# Altium footprint library AOO.PcbLib: 131 footprints (part 9 of 9)
Each footprint in its own frame and in the unit in brackets; x right, y up, seen from the top. Pads: shape width x height; smd on the part's side, far side on the other; paste and mask are expansions set on the pad; w line width, h text height; cw(c..) or ccw(c..) is an arc to the next point about the centre after c.
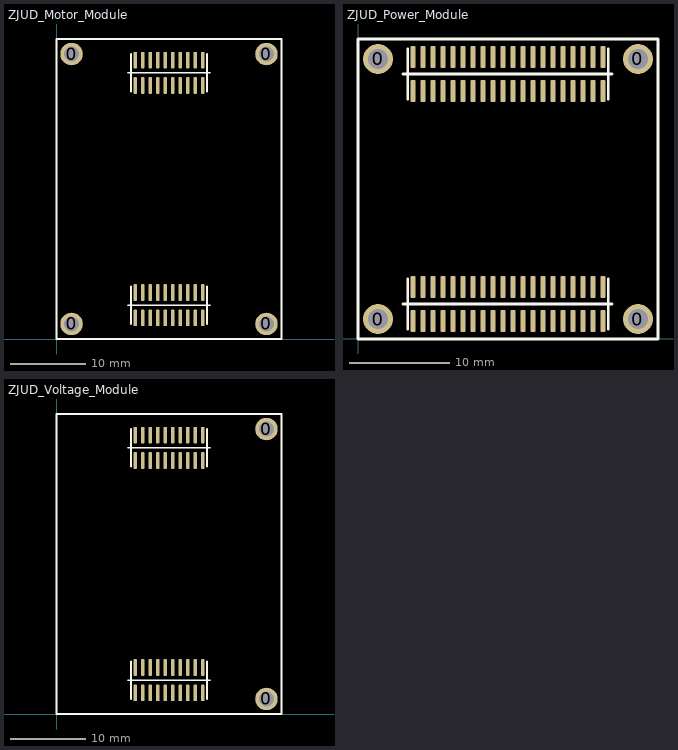
[diagram p8: the footprints below, top view; thin cyan lines are the x and y axes]

## ZJUD_Motor_Module [mm]
pads (44):
  round 3 hole 2: 0(2,2) 0(2,38) 0(28,2) 0(28,38)
  rrect50% 0.5x2.2 smd: 1(10.5,37.2) 2(10.5,33.8) 3(11.5,37.2) 4(11.5,33.8) 5(12.5,37.2) 6(12.5,33.8) 7(13.5,37.2) 8(13.5,33.8) 9(14.5,37.2) 10(14.5,33.8) 11(15.5,37.2) 12(15.5,33.8) 13(16.5,37.2) 14(16.5,33.8) 15(17.5,37.2) 16(17.5,33.8) 17(18.5,37.2) 18(18.5,33.8) 19(19.5,37.2) 20(19.5,33.8) 21(10.5,6.2) 22(10.5,2.8) 23(11.5,6.2) 24(11.5,2.8) 25(12.5,6.2) 26(12.5,2.8) 27(13.5,6.2) 28(13.5,2.8) 29(14.5,6.2) 30(14.5,2.8) 31(15.5,6.2) 32(15.5,2.8) 33(16.5,6.2) 34(16.5,2.8) 35(17.5,6.2) 36(17.5,2.8) 37(18.5,6.2) 38(18.5,2.8) 39(19.5,6.2) 40(19.5,2.8)
Top Overlay:
  lines w0.254: 9.5,4.5 20.5,4.5 ; 9.5,35.5 20.5,35.5 ; 9.96,2 9.96,7 ; 9.96,33 9.96,38 ; 20.04,2 20.04,7 ; 20.04,33 20.04,38 ; 0,0 30,0 30,40 0,40 0,0
3D body: height 8.62, standoff 0.02, extent 0,0 30,40

## ZJUD_Power_Module [mm]
pads (84):
  round 3 hole 2: 0(2,2) 0(2,28) 0(28,2) 0(28,28)
  rrect50% 0.5x2.2 smd: 1(5.5,28.2) 2(5.5,24.8) 3(6.5,28.2) 4(6.5,24.8) 5(7.5,28.2) 6(7.5,24.8) 7(8.5,28.2) 8(8.5,24.8) 9(9.5,28.2) 10(9.5,24.8) 11(10.5,28.2) 12(10.5,24.8) 13(11.5,28.2) 14(11.5,24.8) 15(12.5,28.2) 16(12.5,24.8) 17(13.5,28.2) 18(13.5,24.8) 19(14.5,28.2) 20(14.5,24.8) 21(15.5,28.2) 22(15.5,24.8) 23(16.5,28.2) 24(16.5,24.8) 25(17.5,28.2) 26(17.5,24.8) 27(18.5,28.2) 28(18.5,24.8) 29(19.5,28.2) 30(19.5,24.8) 31(20.5,28.2) 32(20.5,24.8) 33(21.5,28.2) 34(21.5,24.8) 35(22.5,28.2) 36(22.5,24.8) 37(23.5,28.2) 38(23.5,24.8) 39(24.5,28.2) 40(24.5,24.8) 41(5.5,5.2) 42(5.5,1.8) 43(6.5,5.2) 44(6.5,1.8) 45(7.5,5.2) 46(7.5,1.8) 47(8.5,5.2) 48(8.5,1.8) 49(9.5,5.2) 50(9.5,1.8) 51(10.5,5.2) 52(10.5,1.8) 53(11.5,5.2) 54(11.5,1.8) 55(12.5,5.2) 56(12.5,1.8) 57(13.5,5.2) 58(13.5,1.8) 59(14.5,5.2) 60(14.5,1.8) 61(15.5,5.2) 62(15.5,1.8) 63(16.5,5.2) 64(16.5,1.8) 65(17.5,5.2) 66(17.5,1.8) 67(18.5,5.2) 68(18.5,1.8) 69(19.5,5.2) 70(19.5,1.8) 71(20.5,5.2) 72(20.5,1.8) 73(21.5,5.2) 74(21.5,1.8) 75(22.5,5.2) 76(22.5,1.8) 77(23.5,5.2) 78(23.5,1.8) 79(24.5,5.2) 80(24.5,1.8)
Top Overlay:
  lines w0.254: 4.5,3.5 25.4,3.5 ; 4.5,26.5 25.4,26.5 ; 4.96,1 4.96,6 ; 4.96,24 4.96,29 ; 25.04,1 25.04,6 ; 25.04,24 25.04,29 ; 0,0 30,0 30,30 0,30 0,0

## ZJUD_Voltage_Module [mm]
pads (42):
  round 3 hole 2: 0(28,2) 0(28,38)
  rrect50% 0.5x2.2 smd: 1(10.5,37.2) 2(10.5,33.8) 3(11.5,37.2) 4(11.5,33.8) 5(12.5,37.2) 6(12.5,33.8) 7(13.5,37.2) 8(13.5,33.8) 9(14.5,37.2) 10(14.5,33.8) 11(15.5,37.2) 12(15.5,33.8) 13(16.5,37.2) 14(16.5,33.8) 15(17.5,37.2) 16(17.5,33.8) 17(18.5,37.2) 18(18.5,33.8) 19(19.5,37.2) 20(19.5,33.8) 21(10.5,6.2) 22(10.5,2.8) 23(11.5,6.2) 24(11.5,2.8) 25(12.5,6.2) 26(12.5,2.8) 27(13.5,6.2) 28(13.5,2.8) 29(14.5,6.2) 30(14.5,2.8) 31(15.5,6.2) 32(15.5,2.8) 33(16.5,6.2) 34(16.5,2.8) 35(17.5,6.2) 36(17.5,2.8) 37(18.5,6.2) 38(18.5,2.8) 39(19.5,6.2) 40(19.5,2.8)
Top Overlay:
  lines w0.254: 9.5,4.5 20.5,4.5 ; 9.5,35.5 20.5,35.5 ; 9.96,2 9.96,7 ; 9.96,33 9.96,38 ; 20.04,2 20.04,7 ; 20.04,33 20.04,38 ; 0,0 30,0 30,40 0,40 0,0
3D body: height 11.12, standoff 0.02, extent 0,0 30,40